# Altium footprint library RNG_Footprints.PcbLib: 134 footprints (part 4 of 9)
Each footprint in its own frame and in the unit in brackets; x right, y up, seen from the top. Pads: shape width x height; smd on the part's side, far side on the other; paste and mask are expansions set on the pad; w line width, h text height; cw(c..) or ccw(c..) is an arc to the next point about the centre after c.
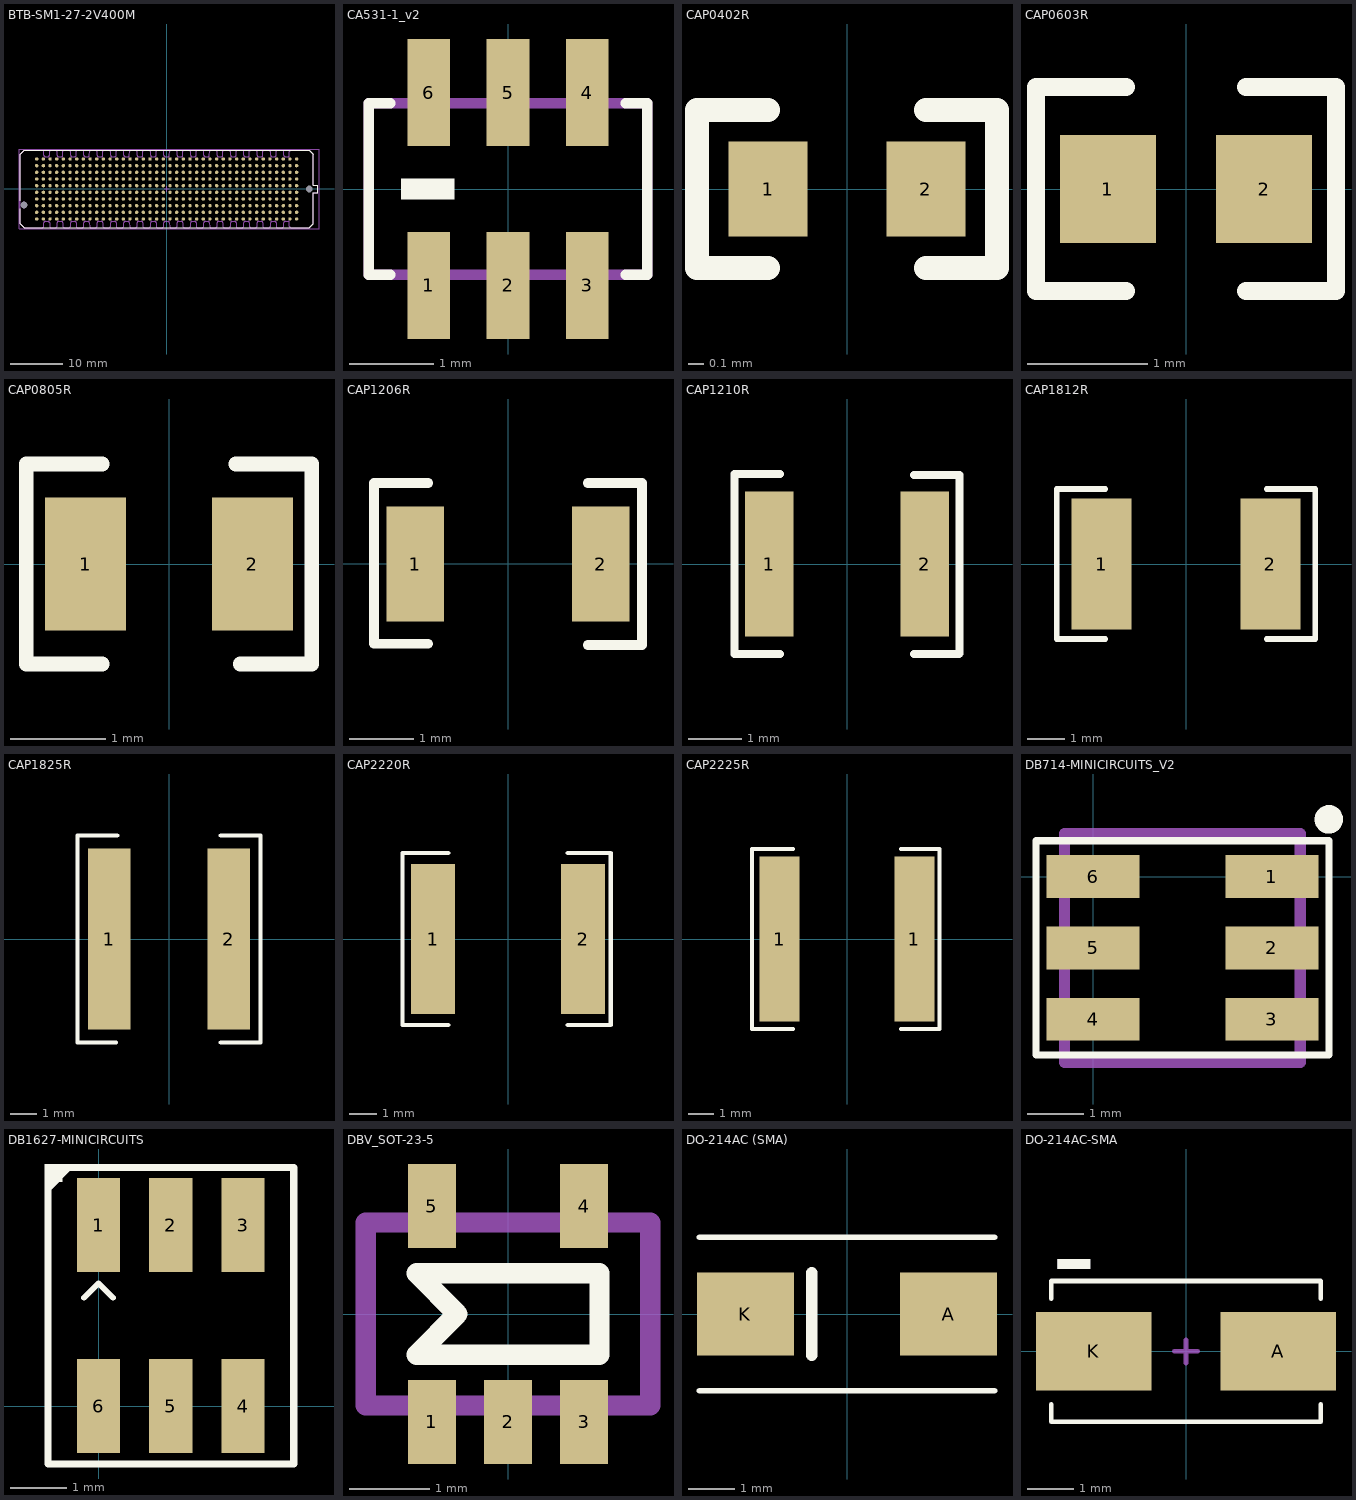
[diagram p3: the footprints below, top view; thin cyan lines are the x and y axes]

## BTB-SM1-27-2V400M [mm] "Board-to-Board Connector, Vertical, 10-Row, Pitch 1.27mm, 400-Position"
height 7.12
pads (402):
  round 0.64 smd: A1(24.765,5.715) A2(23.495,5.715) A3(22.225,5.715) A4(20.955,5.715) A5(19.685,5.715) A6(18.415,5.715) A7(17.145,5.715) A8(15.875,5.715) A9(14.605,5.715) A10(13.335,5.715) A11(12.065,5.715) A12(10.795,5.715) A13(9.525,5.715) A14(8.255,5.715) A15(6.985,5.715) A16(5.715,5.715) A17(4.445,5.715) A18(3.175,5.715) A19(1.905,5.715) A20(0.635,5.715) A21(-0.635,5.715) A22(-1.905,5.715) A23(-3.175,5.715) A24(-4.445,5.715) A25(-5.715,5.715) A26(-6.985,5.715) A27(-8.255,5.715) A28(-9.525,5.715) A29(-10.795,5.715) A30(-12.065,5.715) A31(-13.335,5.715) A32(-14.605,5.715) A33(-15.875,5.715) A34(-17.145,5.715) A35(-18.415,5.715) A36(-19.685,5.715) A37(-20.955,5.715) A38(-22.225,5.715) A39(-23.495,5.715) A40(-24.765,5.715) B1(24.765,4.445) B2(23.495,4.445) B3(22.225,4.445) B4(20.955,4.445) B5(19.685,4.445) B6(18.415,4.445) B7(17.145,4.445) B8(15.875,4.445) B9(14.605,4.445) B10(13.335,4.445) B11(12.065,4.445) B12(10.795,4.445) B13(9.525,4.445) B14(8.255,4.445) B15(6.985,4.445) B16(5.715,4.445) B17(4.445,4.445) B18(3.175,4.445) B19(1.905,4.445) B20(0.635,4.445) B21(-0.635,4.445) B22(-1.905,4.445) B23(-3.175,4.445) B24(-4.445,4.445) B25(-5.715,4.445) B26(-6.985,4.445) B27(-8.255,4.445) B28(-9.525,4.445) B29(-10.795,4.445) B30(-12.065,4.445) B31(-13.335,4.445) B32(-14.605,4.445) B33(-15.875,4.445) B34(-17.145,4.445) B35(-18.415,4.445) B36(-19.685,4.445) B37(-20.955,4.445) B38(-22.225,4.445) B39(-23.495,4.445) B40(-24.765,4.445) C1(24.765,3.175) C2(23.495,3.175) C3(22.225,3.175) C4(20.955,3.175) C5(19.685,3.175) C6(18.415,3.175) C7(17.145,3.175) C8(15.875,3.175) C9(14.605,3.175) C10(13.335,3.175) C11(12.065,3.175) C12(10.795,3.175) C13(9.525,3.175) C14(8.255,3.175) C15(6.985,3.175) C16(5.715,3.175) C17(4.445,3.175) C18(3.175,3.175) C19(1.905,3.175) C20(0.635,3.175) C21(-0.635,3.175) C22(-1.905,3.175) C23(-3.175,3.175) C24(-4.445,3.175) C25(-5.715,3.175) C26(-6.985,3.175) C27(-8.255,3.175) C28(-9.525,3.175) C29(-10.795,3.175) C30(-12.065,3.175) C31(-13.335,3.175) C32(-14.605,3.175) C33(-15.875,3.175) C34(-17.145,3.175) C35(-18.415,3.175) C36(-19.685,3.175) C37(-20.955,3.175) C38(-22.225,3.175) C39(-23.495,3.175) C40(-24.765,3.175) D1(24.765,1.905) D2(23.495,1.905) D3(22.225,1.905) D4(20.955,1.905) D5(19.685,1.905) D6(18.415,1.905) D7(17.145,1.905) D8(15.875,1.905) D9(14.605,1.905) D10(13.335,1.905) D11(12.065,1.905) D12(10.795,1.905) D13(9.525,1.905) D14(8.255,1.905) D15(6.985,1.905) D16(5.715,1.905) D17(4.445,1.905) D18(3.175,1.905) D19(1.905,1.905) D20(0.635,1.905) D21(-0.635,1.905) D22(-1.905,1.905) D23(-3.175,1.905) D24(-4.445,1.905) D25(-5.715,1.905) D26(-6.985,1.905) D27(-8.255,1.905) D28(-9.525,1.905) D29(-10.795,1.905) D30(-12.065,1.905) D31(-13.335,1.905) D32(-14.605,1.905) D33(-15.875,1.905) D34(-17.145,1.905) D35(-18.415,1.905) D36(-19.685,1.905) D37(-20.955,1.905) D38(-22.225,1.905) D39(-23.495,1.905) D40(-24.765,1.905) E1(24.765,0.635) E2(23.495,0.635) E3(22.225,0.635) E4(20.955,0.635) E5(19.685,0.635) E6(18.415,0.635) E7(17.145,0.635) E8(15.875,0.635) E9(14.605,0.635) E10(13.335,0.635) E11(12.065,0.635) E12(10.795,0.635) E13(9.525,0.635) E14(8.255,0.635) E15(6.985,0.635) E16(5.715,0.635) E17(4.445,0.635) E18(3.175,0.635) E19(1.905,0.635) E20(0.635,0.635) E21(-0.635,0.635) E22(-1.905,0.635) E23(-3.175,0.635) E24(-4.445,0.635) E25(-5.715,0.635) E26(-6.985,0.635) E27(-8.255,0.635) E28(-9.525,0.635) E29(-10.795,0.635) E30(-12.065,0.635) E31(-13.335,0.635) E32(-14.605,0.635) E33(-15.875,0.635) E34(-17.145,0.635) E35(-18.415,0.635) E36(-19.685,0.635) E37(-20.955,0.635) E38(-22.225,0.635) E39(-23.495,0.635) E40(-24.765,0.635) F1(24.765,-0.635) F2(23.495,-0.635) F3(22.225,-0.635) F4(20.955,-0.635) F5(19.685,-0.635) F6(18.415,-0.635) F7(17.145,-0.635) F8(15.875,-0.635) F9(14.605,-0.635) F10(13.335,-0.635) F11(12.065,-0.635) F12(10.795,-0.635) F13(9.525,-0.635) F14(8.255,-0.635) F15(6.985,-0.635) F16(5.715,-0.635) F17(4.445,-0.635) F18(3.175,-0.635) F19(1.905,-0.635) F20(0.635,-0.635) F21(-0.635,-0.635) F22(-1.905,-0.635) F23(-3.175,-0.635) F24(-4.445,-0.635) F25(-5.715,-0.635) F26(-6.985,-0.635) F27(-8.255,-0.635) F28(-9.525,-0.635) F29(-10.795,-0.635) F30(-12.065,-0.635) F31(-13.335,-0.635) F32(-14.605,-0.635) F33(-15.875,-0.635) F34(-17.145,-0.635) F35(-18.415,-0.635) F36(-19.685,-0.635) F37(-20.955,-0.635) F38(-22.225,-0.635) F39(-23.495,-0.635) F40(-24.765,-0.635) G1(24.765,-1.905) G2(23.495,-1.905) G3(22.225,-1.905) G4(20.955,-1.905) G5(19.685,-1.905) G6(18.415,-1.905) G7(17.145,-1.905) G8(15.875,-1.905) G9(14.605,-1.905) G10(13.335,-1.905) G11(12.065,-1.905) G12(10.795,-1.905) G13(9.525,-1.905) G14(8.255,-1.905) G15(6.985,-1.905) G16(5.715,-1.905) G17(4.445,-1.905) G18(3.175,-1.905) G19(1.905,-1.905) G20(0.635,-1.905) G21(-0.635,-1.905) G22(-1.905,-1.905) G23(-3.175,-1.905) G24(-4.445,-1.905) G25(-5.715,-1.905) G26(-6.985,-1.905) G27(-8.255,-1.905) G28(-9.525,-1.905) G29(-10.795,-1.905) G30(-12.065,-1.905) G31(-13.335,-1.905) G32(-14.605,-1.905) G33(-15.875,-1.905) G34(-17.145,-1.905) G35(-18.415,-1.905) G36(-19.685,-1.905) G37(-20.955,-1.905) G38(-22.225,-1.905) G39(-23.495,-1.905) G40(-24.765,-1.905) H1(24.765,-3.175) H2(23.495,-3.175) H3(22.225,-3.175) H4(20.955,-3.175) H5(19.685,-3.175) H6(18.415,-3.175) H7(17.145,-3.175) H8(15.875,-3.175) H9(14.605,-3.175) H10(13.335,-3.175) H11(12.065,-3.175) H12(10.795,-3.175) H13(9.525,-3.175) H14(8.255,-3.175) H15(6.985,-3.175) H16(5.715,-3.175) H17(4.445,-3.175) H18(3.175,-3.175) H19(1.905,-3.175) H20(0.635,-3.175) H21(-0.635,-3.175) H22(-1.905,-3.175) H23(-3.175,-3.175) H24(-4.445,-3.175) H25(-5.715,-3.175) H26(-6.985,-3.175) H27(-8.255,-3.175) H28(-9.525,-3.175) H29(-10.795,-3.175) H30(-12.065,-3.175) H31(-13.335,-3.175) H32(-14.605,-3.175) H33(-15.875,-3.175) H34(-17.145,-3.175) H35(-18.415,-3.175) H36(-19.685,-3.175) H37(-20.955,-3.175) H38(-22.225,-3.175) H39(-23.495,-3.175) H40(-24.765,-3.175) J1(24.765,-4.445) J2(23.495,-4.445) J3(22.225,-4.445) J4(20.955,-4.445) J5(19.685,-4.445) J6(18.415,-4.445) J7(17.145,-4.445) J8(15.875,-4.445) J9(14.605,-4.445) J10(13.335,-4.445) J11(12.065,-4.445) J12(10.795,-4.445) J13(9.525,-4.445) J14(8.255,-4.445) J15(6.985,-4.445) J16(5.715,-4.445) J17(4.445,-4.445) J18(3.175,-4.445) J19(1.905,-4.445) J20(0.635,-4.445) J21(-0.635,-4.445) J22(-1.905,-4.445) J23(-3.175,-4.445) J24(-4.445,-4.445) J25(-5.715,-4.445) J26(-6.985,-4.445) J27(-8.255,-4.445) J28(-9.525,-4.445) J29(-10.795,-4.445) J30(-12.065,-4.445) J31(-13.335,-4.445) J32(-14.605,-4.445) J33(-15.875,-4.445) J34(-17.145,-4.445) J35(-18.415,-4.445) J36(-19.685,-4.445) J37(-20.955,-4.445) J38(-22.225,-4.445) J39(-23.495,-4.445) J40(-24.765,-4.445) K1(24.765,-5.715) K2(23.495,-5.715) K3(22.225,-5.715) K4(20.955,-5.715) K5(19.685,-5.715) K6(18.415,-5.715) K7(17.145,-5.715) K8(15.875,-5.715) K9(14.605,-5.715) K10(13.335,-5.715) K11(12.065,-5.715) K12(10.795,-5.715) K13(9.525,-5.715) K14(8.255,-5.715) K15(6.985,-5.715) K16(5.715,-5.715) K17(4.445,-5.715) K18(3.175,-5.715) K19(1.905,-5.715) K20(0.635,-5.715) K21(-0.635,-5.715) K22(-1.905,-5.715) K23(-3.175,-5.715) K24(-4.445,-5.715) K25(-5.715,-5.715) K26(-6.985,-5.715) K27(-8.255,-5.715) K28(-9.525,-5.715) K29(-10.795,-5.715) K30(-12.065,-5.715) K31(-13.335,-5.715) K32(-14.605,-5.715) K33(-15.875,-5.715) K34(-17.145,-5.715) K35(-18.415,-5.715) K36(-19.685,-5.715) K37(-20.955,-5.715) K38(-22.225,-5.715) K39(-23.495,-5.715) K40(-24.765,-5.715)
  round 0.97 hole 1.27 unplated: MH1(-27.19,-3.05) MH2(27.19,0)
Top Overlay:
  lines w0.2: -27.888,-3.75 -27.888,-6.58 -27.126,-7.343 -23.647,-7.343 23.648,-7.343 27.128,-7.343 27.89,-6.58 27.89,-0.764 28.779,-0.764 28.779,0.76 27.89,0.76 27.89,6.577 27.128,7.339 23.648,7.339 -23.647,7.339 -27.126,7.339 -27.888,6.577 -27.888,-2.25
Mechanical 13:
  drawing of 324 lines, arcs and shapes, not listed
Mechanical 15:
  lines w0.1: -28.139,-7.593 29.029,-7.593 29.029,7.589 -28.139,7.589 -28.139,-7.589 ; -0.5,0 0.5,0 ; 0,-0.5 0,0.5
3D body: height 0.73, standoff -1.27, extent 26.636,-0.51 27.752,0.608
3D body: height 2, standoff 0.35, extent 26.493,-0.764 27.89,0.76
3D body: height 2, standoff 0.35, extent -27.889,-3.812 -26.492,-2.288
3D body: height 2, standoff 0.6, extent 26.493,-6.581 27.89,6.577
3D body: height 2, standoff 0.1, extent 26.493,5.685 27.89,6.576
3D body: height 2, standoff 0.1, extent 26.493,2.284 27.89,3.808
3D body: height 2, standoff 0.1, extent 26.493,-3.812 27.89,-2.288
3D body: height 2, standoff 0.1, extent 26.493,-6.581 27.89,-5.69
3D body: height 6.2, standoff 0.84, extent -26.949,-5.742 -25.653,-2.009
3D body: height 6.2, standoff 0.84, extent -26.949,2.005 -25.653,5.738
3D body: height 6.2, standoff 0.84, extent -26.949,-1.882 -25.349,2.005
3D body: height 6.2, standoff 0.84, extent 26.29,-1.882 27.89,2.005
3D body: height 6.2, standoff 0.84, extent -26.949,1.878 26.95,3.198
3D body: height 3.45, standoff 0.84, extent -27.889,-7.343 28.779,7.339
3D body: height 6.2, standoff 0.84, extent -26.949,-5.742 26.95,-4.422
3D body: height 6.2, standoff 0.84, extent -26.949,4.418 26.95,5.738
3D body: height 6.2, standoff 0.84, extent -26.949,-3.202 26.95,-1.882
3D body: height 6.2, standoff 0.84, extent -25.653,-0.662 26.29,0.658
3D body: height 6.2, standoff 0.84, extent 25.655,-5.742 26.95,-2.009
3D body: height 6.2, standoff 0.84, extent 25.655,2.005 26.95,5.738
3D body: height 7.21, standoff 0.84, extent 26.696,-2.009 27.89,-0.701
3D body: height 7.21, standoff 0.84, extent 26.696,0.697 27.89,2.005
3D body: height 7.21, standoff 0.84, extent -27.889,3.046 -26.731,4.57
3D body: height 7.21, standoff 0.84, extent -27.889,-4.574 -26.731,-3.05
3D body: height 6.32, standoff 6.2, extent -5.129,-5.129 5.129,5.129
3D body: height 2, standoff 0.1, extent 27.89,-0.764 28.779,0.76
3D body: height 2, standoff 0.1, extent -27.888,5.685 -26.491,6.576
3D body: height 2, standoff 0.1, extent -27.889,2.284 -26.492,3.808
3D body: height 2, standoff 0.1, extent -27.889,-6.583 -26.492,-5.692
3D body: height 2, standoff 0.1, extent -27.889,-0.764 -26.492,0.762
3D body: height 2, standoff -1.27, extent -27.63,-3.597 -26.751,-2.503

## CA531-1_v2 [mil] "Mini-Circuits Case Style CA531-1 for Directional Couplers"
height 64
pads (6):
  rect 20x50 smd: 1(-37,-45) 2(0,-45) 3(37,-45) 4(37,45) 5(0,45) 6(-37,45)
Top Overlay:
  rectangle: -50,-5 -25,5
  lines w5: -55,-40 -65,-40 -65,40 -55,40 ; 55,-40 65,-40 65,40 55,40
Mechanical 15:
  lines w5: -65,-40 65,-40 65,40 -65,40 -65,-40
3D body: height 64, standoff 0, extent -61,-33.5 61,33.5

## CAP0402R [mm] "Capacitor 0402 reflow soldering"
pads (2):
  rect 0.5x0.6 smd: 1(-0.5,0) 2(0.5,0)
Top Overlay:
  lines w0.152: -0.5,-0.5 -0.95,-0.5 -0.95,0.5 -0.5,0.5 ; 0.5,-0.5 0.95,-0.5 0.95,0.5 0.5,0.5
3D body "CAP0402.stp": height 0.2, standoff 0, extent -0.5,-0.3 0.5,0.3

## CAP0603R [mm] "capacitor 0603 reflow soldering"
pads (2):
  rect 0.8x0.9 smd: 1(-0.65,0) 2(0.65,0)
Top Overlay:
  lines w0.152: -0.5,-0.85 -1.25,-0.85 -1.25,0.85 -0.5,0.85 ; 0.5,-0.85 1.25,-0.85 1.25,0.85 0.5,0.85
3D body "CAP0603.stp": height 0.3, standoff 0, extent -0.8,-0.4 0.8,0.4

## CAP0805R [mm] "capacitor 0805 reflow soldering"
pads (2):
  rect 0.85x1.4 smd: 1(-0.875,0) 2(0.875,0)
Top Overlay:
  lines w0.152: -0.7,-1.05 -1.5,-1.05 -1.5,1.05 -0.7,1.05 ; 0.7,1.05 1.5,1.05 1.5,-1.05 0.75,-1.05
3D body "CAP0805.stp": height 0.78, standoff 0, extent -1,-0.625 1,0.625

## CAP1206R [mm] "capacitor 1206 reflow soldering"
pads (2):
  rect 0.9x1.8 smd: 1(-1.45,0) 2(1.45,0)
Top Overlay:
  lines w0.152: -1.25,-1.25 -2.1,-1.25 -2.1,1.27 -1.25,1.27 ; 1.25,-1.27 2.1,-1.27 2.1,1.27 1.25,1.27
3D body "CAP1206.stp": height 1, standoff 0, extent -1.6,-0.8 1.6,0.8

## CAP1210R [mm] "capacitor 1210 reflow soldering"
pads (2):
  rect 0.9x2.7 smd: 1(-1.45,0) 2(1.45,0)
Top Overlay:
  lines w0.152: -1.25,-1.68 -2.1,-1.68 -2.1,1.68 -1.25,1.68 ; 1.25,-1.68 2.09,-1.68 2.1,-1.67 2.1,1.66 1.25,1.66
3D body "CAP1210.stp": height 0.92, standoff -0.02, extent -1.6,-1.25 1.6,1.25

## CAP1812R [mm] "capacitor 1812 reflow soldering"
pads (2):
  rect 1.6x3.5 smd: 1(-2.25,0) 2(2.25,0)
Top Overlay:
  lines w0.152: -2.15,-2 -3.45,-2 -3.45,2 -2.15,2 ; 2.15,-2 3.45,-2 3.45,2 2.15,2
3D body "CAP1812.stp": height 1.6, standoff 0, extent -2.25,-1.6 2.25,1.6

## CAP1825R [mm] "capacitor 1825 reflow soldering"
pads (2):
  rect 1.6x6.8 smd: 1(-2.25,0) 2(2.25,0)
Top Overlay:
  lines w0.152: -2,-3.9 -3.45,-3.9 -3.45,3.9 -1.95,3.9 ; 1.95,-3.9 3.45,-3.9 3.45,3.9 1.95,3.9
3D body "CAP1825.stp": height 1.22, standoff -0.02, extent -2.25,-3.2 2.25,3.2

## CAP2220R [mm] "capacitor 2220 reflow soldering"
pads (2):
  rect 1.6x5.4 smd: 1(-2.7,0) 2(2.7,0)
Top Overlay:
  lines w0.152: -2.15,-3.1 -3.8,-3.1 -3.8,3.1 -2.15,3.1 ; 2.15,-3.1 3.7,-3.1 3.7,3.1 2.15,3.1
3D body "CAP2220.stp": height 2.24, standoff -0.04, extent -2.85,-2.5 2.85,2.5

## CAP2225R [mm] "capacitor 2225 reflow soldering"
pads (2):
  rect 1.6x6.6 smd: 1(-2.7,0) 1(2.7,0)
Top Overlay:
  lines w0.152: -2.15,-3.6 -3.8,-3.6 -3.8,3.6 -2.15,3.6 ; 2.15,-3.6 3.7,-3.6 3.7,3.6 2.15,3.6
3D body "CAP2225.stp": height 1.44, standoff -0.04, extent -2.85,-3.175 2.87,3.175

## DB714-MINICIRCUITS_V2 [mm] "DB714 Footprint for Mini-Circuits Directional Couplers"
height 4.06
pads (6):
  rect 1.65x0.76 smd: 1(3.18,0) 2(3.18,-1.27) 3(3.18,-2.54) 4(0,-2.54) 5(0,-1.27) 6(0,0)
Top Overlay:
  circle w0.254: c4.191,1.016 r0.127
  lines w0.127: -1.016,-3.175 -1.016,0.635 4.191,0.635 4.191,-3.175 -1.016,-3.175
Mechanical 15:
  lines w0.2: -0.508,-3.302 3.683,-3.302 3.683,0.762 -0.508,0.762 -0.508,-3.302
3D body: height 4.06, standoff 0.18, extent -0.315,-3.175 3.495,0.635

## DB1627-MINICIRCUITS [mm] "Mini-Circuits DB1627 Case for TCM1-63AX+"
height 4.06
pads (6):
  rect 0.76x1.65 smd: 1(0,3.18) 2(1.27,3.18) 3(2.54,3.18) 4(2.54,0) 5(1.27,0) 6(0,0)
Top Overlay:
  rectangle: -0.953,3.937 -0.635,4.255
  lines w0.1: -0.889,3.81 -0.508,4.191 ; -0.254,1.905 0,2.159 0.254,1.905
  lines w0.127: -0.889,-1.016 3.429,-1.016 3.429,4.191 -0.889,4.191 -0.889,-1.016
3D body "SW3dPS-tcp-2-10.STEP": height 4.1, standoff 0, extent -0.686,-0.826 3.181,4

## DBV_SOT-23-5 [mm] "TI DBV Package for Low-Power Single-Gate Inverter"
height 1.45
pads (5):
  rect 0.6x1.05 smd paste-0.05 mask+0.07: 1(-0.95,-1.35) 2(0,-1.35) 3(0.95,-1.35) 4(0.95,1.35) 5(-0.95,1.35)
Top Overlay:
  lines w0.254: -1.143,-0.508 -0.635,0 -1.143,0.508 1.143,0.508 1.143,-0.508 -1.143,-0.508
  text "." at -1.778,-0.762 h1.52
Mechanical 15:
  lines w0.254: -1.778,-1.143 -1.778,1.143 1.778,1.143 1.778,-1.143 -1.778,-1.143
3D body: height 1.45, standoff 0, extent -1.525,-0.875 1.525,0.875

## DO-214AC (SMA) [mil] "DO-214AC for Littelfuse TVS Diodes SMAJ Series"
height 90
pads (2):
  rect 82x70 smd: A(86,0) K(-86,0)
Top Overlay:
  lines w5: -125,-65 125,-65 ; -125,65 125,65
  lines w9.84: -30,-35 -30,35
3D body "User Library-SMAJ.STEP": height 78.94, standoff 0.48, extent -97.04,-50 97.05,50

## DO-214AC-SMA [mm] "SMT Diode, Package DO-214AC (SMA)"
height 2.3
pads (2):
  rect 2.5x1.7 smd: A(2,0) K(-2,0)
Top Overlay:
  lines w0.1: -2.921,-1.143 -2.921,-1.524 2.921,-1.524 2.921,-1.143 ; -2.921,1.143 -2.921,1.524 2.921,1.524 2.921,1.143
  text "-" at -2.921,1.143 h2
Mechanical 15:
  lines w0.1: -0.254,0 0.254,0 ; 0,-0.254 0,0.254
3D body "User Library-DIOM5528X26.STEP": height 2.6, standoff 0.03, extent -2.75,-1.4 2.75,1.4